# Altium footprint library CUSTOM PCB.PcbLib: 404 footprints (part 20 of 26)
Each footprint in its own frame and in the unit in brackets; x right, y up, seen from the top. Pads: shape width x height; smd on the part's side, far side on the other; paste and mask are expansions set on the pad; w line width, h text height; cw(c..) or ccw(c..) is an arc to the next point about the centre after c.
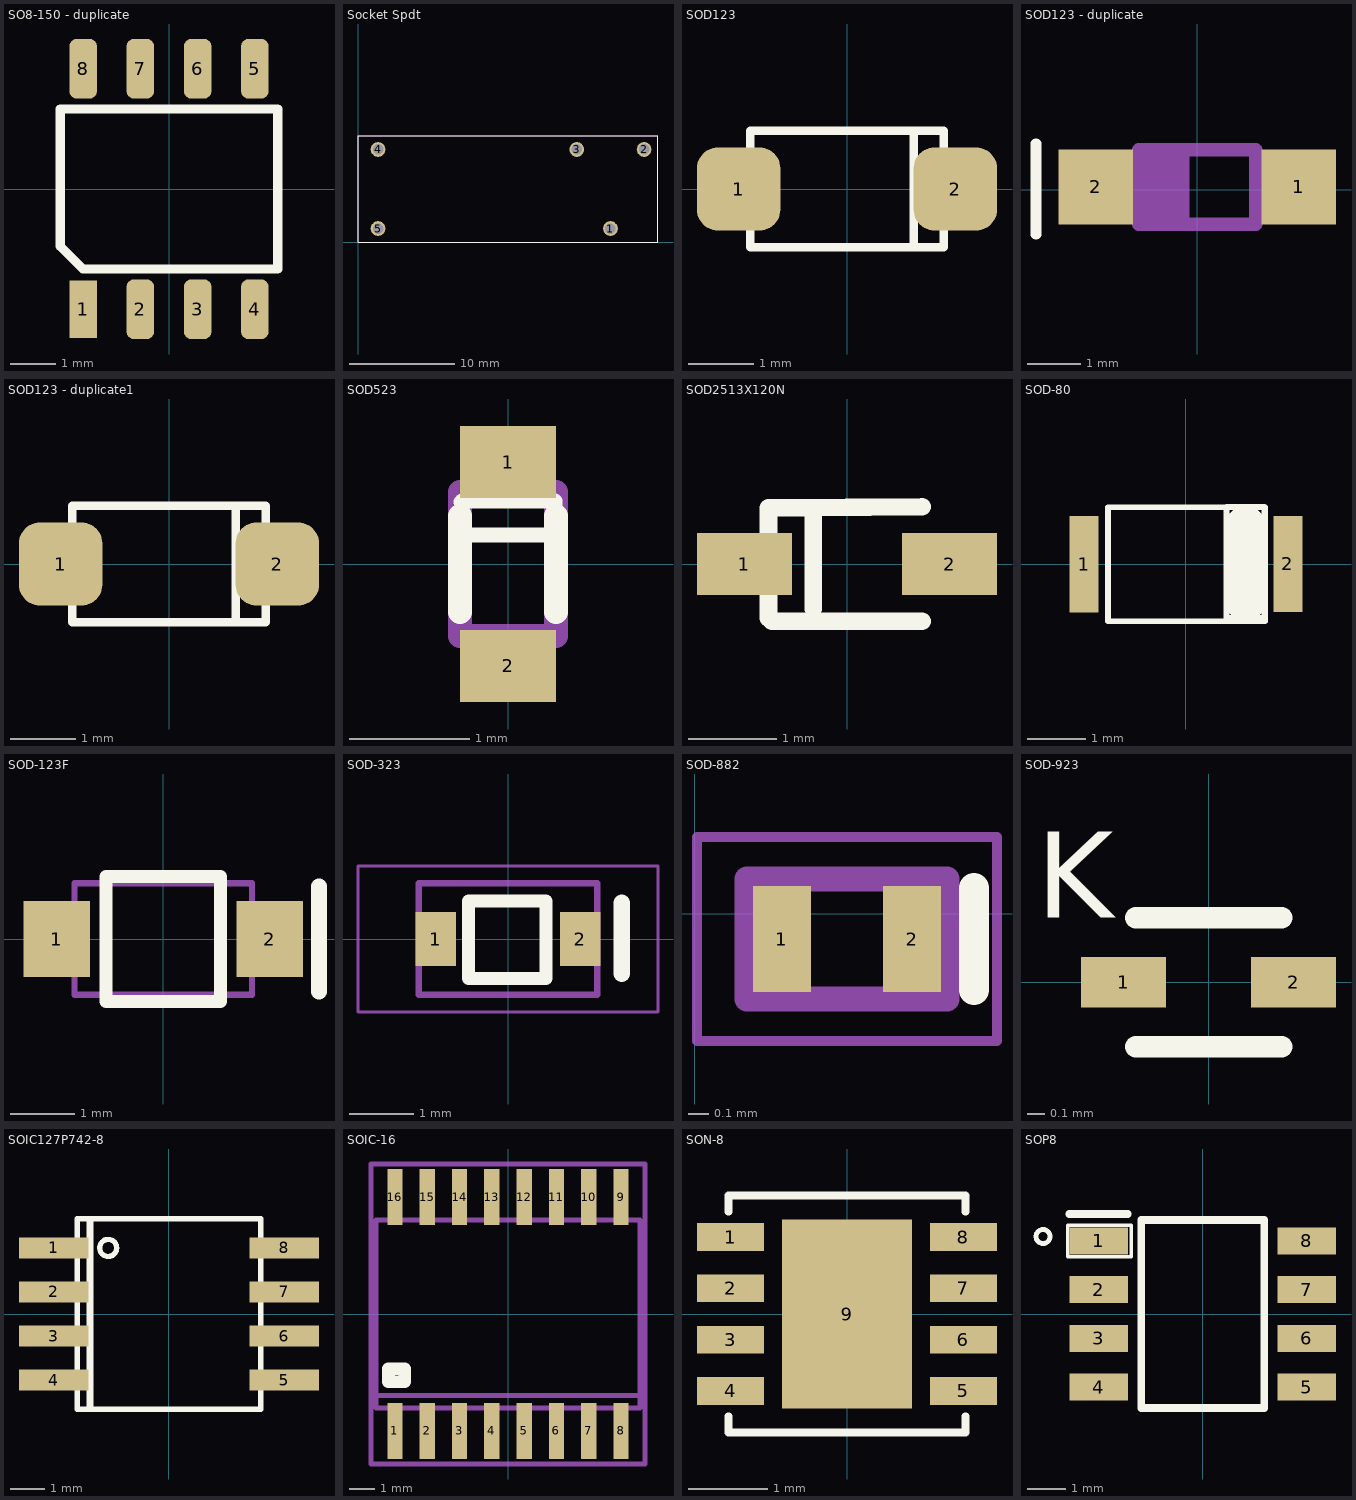
[diagram p19: the footprints below, top view; thin cyan lines are the x and y axes]

## SO8-150 - duplicate [mil]
pads (8):
  rect 24x50 smd mask+4: 1(-75,-105)
  rrect50% 24x52 smd mask+4: 2(-25,-105) 3(25,-105) 4(75,-105) 5(75,105) 6(25,105) 7(-25,105) 8(-75,105)
Top Overlay:
  lines w8: -95.01,-49.99 -75,-70 95,-70 95,70 -95.01,70 -95.01,-49.99
3D body "SO8-150.STEP": height 67, standoff 0, extent -95.01,-122.01 94.99,121.99

## Socket Spdt [mm] "RY211005"
pads (5):
  round 1.4 hole 1: 1(24.003,1.321) 2(27.203,8.839) 3(20.803,8.839) 4(1.905,8.839) 5(1.905,1.321)
Top Overlay:
  lines w0.025: 0,0 0,10.16 28.524,10.16 28.524,0 0,0
Mechanical 1:
  lines w0.025: 0,0 0,10.16 28.524,10.16 28.524,0 0,0
3D body "c-4-1393224-2-a-3d.stp": height 12.3, standoff -3.2, extent 0.012,0.03 28.512,10.13

## SOD123 [mil]
pads (2):
  rrect50% 50x50 smd: 1(-65,0) 2(65,0)
Top Overlay:
  lines w5: 40,-35 40,35 ; -58,-35 58,-35 58,35 -58,35 -58,-35
3D body "SOD-123.STEP": height 46.85, standoff -3.15, extent -77,-35.43 76.54,35.43

## SOD123 - duplicate [mm]
pads (2):
  rect 1.4x1.4 smd: 1(1.9,0.051) 2(-1.9,0.051)
Top Overlay:
  lines w0.2: -3.023,-0.838 -3.023,0.864
Mechanical 4:
  region: -1.952,0.451 -1.2,0.451 -1.2,-0.4 -1.952,-0.4
  region: 1.201,0.451 1.95,0.451 1.95,-0.4 1.201,-0.4
  region: -1.05,0.751 -0.15,0.751 -0.15,-0.599 -1.05,-0.599
  region: -1.952,0.451 -1.2,0.451 -1.2,-0.4 -1.952,-0.4
  region: 1.201,0.451 1.95,0.451 1.95,-0.4 1.201,-0.4
  region: -1.05,0.751 -0.15,0.751 -0.15,-0.599 -1.05,-0.599
  lines w0.254: -1.1,-0.649 1.1,-0.649 ; -1.1,-0.649 -1.1,0.751 ; -1.1,-0.649 1.1,-0.649 ; -1.1,-0.649 -1.1,0.751 ; -1.1,0.751 1.1,0.751 ; -1.1,0.751 1.1,0.751 ; 1.1,-0.649 1.1,0.751 ; 1.1,-0.649 1.1,0.751
3D body "sod123 v4.step": height 1.2, standoff 0, extent -1.875,-0.787 1.875,0.913

## SOD123 - duplicate1 [mil]
pads (2):
  rrect50% 50x50 smd: 1(-65,0) 2(65,0)
Top Overlay:
  lines w5: 40,-35 40,35 ; -58,-35 -58,35 58,35 58,-35 -58,-35
3D body "SOD-123.STEP": height 46.85, standoff -3.15, extent -77,-35.43 76.54,35.43

## SOD523 [mm]
pads (2):
  rect 0.8x0.6 smd: 1(0,0.85) 2(0,-0.85)
Top Overlay:
  lines w0.127: -0.389,0.242 0.391,0.242 0.391,0.524 -0.382,0.524 -0.389,0.517
  lines w0.2: -0.4,-0.4 -0.4,0.4 ; 0.4,-0.4 0.4,0.4
Mechanical 15:
  lines w0.2: -0.4,-0.6 -0.4,0.6 0.4,0.6 0.4,-0.6 -0.4,-0.6
3D body "User Library-SOD-523F.step": height 0.7, standoff 0, extent -0.399,-0.8 0.399,0.8

## SOD2513X120N [mm]
pads (2):
  rect 1.075x0.7 smd: 1(-1.162,0) 2(1.162,0)
Top Overlay:
  lines w0.2: -0.889,-0.611 -0.889,0.635 0.85,0.65 ; -0.85,-0.65 0.85,-0.65 ; -0.381,-0.508 -0.381,0.635
3D body "1N4148WS-7-F.stp": height 1.2, standoff 0, extent -1.338,-0.65 1.162,0.65

## SOD-80 [mm]
pads (2):
  rect 0.5x1.65 smd: 1(-1.747,-0.003) 2(1.747,0.003)
Top Overlay:
  lines w0.1: 1.346,0.981 0.695,0.981 0.695,-0.926 1.346,-0.926 1.346,0.985 ; -1.336,-0.98 -1.336,0.975 1.354,0.975 1.354,-0.98 -1.336,-0.98
  lines w0.7: 1.02,-0.627 1.02,0.647
3D body "User Library-SOD-80.STEP": height 1.45, standoff -0.05, extent -1.72,-0.753 1.739,0.757

## SOD-123F [mm]
pads (2):
  rect 1.03x1.17 smd: 1(-1.65,0) 2(1.65,0)
Top Overlay:
  lines w0.2: -0.889,-0.965 -0.889,0.965 0.889,0.965 0.889,-0.965 -0.889,-0.965
  lines w0.254: 2.413,-0.813 2.413,0.813
Mechanical 15:
  lines w0.1: -1.375,-0.862 1.375,-0.862 1.375,0.862 -1.375,0.862 -1.375,-0.862
3D body "SOD-123FL.SLDPRT": height 1.27, standoff -0.08, extent -1.925,-1.076 1.925,1.077

## SOD-323 [mm]
pads (2):
  rect 0.63x0.83 smd: 1(-1.115,0) 2(1.115,0)
Top Overlay:
  lines w0.2: -0.61,-0.61 -0.61,0.584 0.584,0.584 0.584,-0.61 -0.61,-0.61
  lines w0.254: 1.753,-0.533 1.753,0.559
Mechanical 15:
  lines w0.1: -1.375,-0.862 1.375,-0.862 1.375,0.862 -1.375,0.862 -1.375,-0.862
Mechanical 20:
  lines w0.05: -2.315,-1.125 2.315,-1.125 2.315,1.125 -2.315,1.125 -2.315,-1.125
3D body "User Library-SOD323.x_t": height 0.9, standoff -0.09, extent -1.25,-0.625 1.25,0.625

## SOD-882 [mm] "zener diode smd"
pads (2):
  rect 0.29x0.53 smd: 1(0.437,-0.127) 2(1.087,-0.127)
Top Overlay:
  lines w0.15: 1.397,-0.381 1.397,0.127
Mechanical 1:
  lines w0.127: 0.262,-0.427 0.262,0.173 1.262,0.173 1.262,-0.427 0.262,-0.427
Mechanical 4:
  lines w0.05: 0.012,-0.637 0.012,0.383 1.512,0.383 1.512,-0.637 0.012,-0.637
3D body "User Library-SOD882.SLDPRT": height 0.39, standoff -0.11, extent 0.251,-0.438 1.273,0.184

## SOD-923 [mm]
pads (2):
  rect 0.5x0.3 smd: 1(-0.5,0) 2(0.5,0)
Top Overlay:
  lines w0.127: -0.43,-0.38 0.43,-0.38 ; -0.43,0.38 0.43,0.38
  text "K" at -1.016,0.381 h0.51
3D body "User Library-DIODE_SOD-923.x_t": height 0.43, standoff 0, extent -0.525,-0.325 0.525,0.325

## SOIC127P742-8 [mm]
pads (8):
  rect 2x0.6 smd: 1(-3.322,1.905) 2(-3.322,0.635) 3(-3.322,-0.635) 4(-3.322,-1.905) 5(3.322,-1.905) 6(3.322,-0.635) 7(3.322,0.635) 8(3.322,1.905)
Top Overlay:
  circle w0.15: c-1.753,1.905 r0.246
  lines w0.15: -2.645,-2.745 2.645,-2.745 2.645,2.745 -2.645,2.745 -2.645,-2.745
  lines w0.2: -2.271,-2.713 -2.271,2.718
3D body "8SIOC.stp": height 1.9, standoff -0.05, extent -3.099,-2.502 3.099,2.502

## SOIC-16 [mm] "Ds3231 RTC"
pads (16):
  rect 0.6x2.2 smd: 1(-4.445,-4.6) 2(-3.175,-4.6) 3(-1.905,-4.6) 4(-0.635,-4.6) 5(0.635,-4.6) 6(1.905,-4.6) 7(3.175,-4.6) 8(4.445,-4.6) 9(4.445,4.6) 10(3.175,4.6) 11(1.905,4.6) 12(0.635,4.6) 13(-0.635,4.6) 14(-1.905,4.6) 15(-3.175,4.6) 16(-4.445,4.6)
Top Overlay:
  lines w0.5: -4.699,-2.667 -4.699,-2.159 -4.064,-2.159 -4.064,-2.667 -4.699,-2.667
Mechanical 4:
  region: -4.698,-3.8 -4.2,-3.8 -4.2,-5.329 -4.698,-5.329
  region: -3.421,-3.8 -2.93,-3.8 -2.93,-5.322 -3.421,-5.322
  region: -2.153,-3.8 -1.66,-3.8 -1.66,-5.326 -2.153,-5.326
  region: -0.882,-3.8 -0.39,-3.8 -0.39,-5.329 -0.882,-5.329
  region: 0.39,-3.8 0.88,-3.8 0.88,-5.321 0.39,-5.321
  region: 1.662,-3.8 2.15,-3.8 2.15,-5.327 1.662,-5.327
  region: 2.932,-3.8 3.42,-3.8 3.42,-5.323 2.932,-5.323
  region: 4.204,-3.8 4.69,-3.8 4.69,-5.325 4.204,-5.325
  region: 4.204,5.32 4.69,5.32 4.69,3.804 4.204,3.804
  region: 2.934,5.32 3.42,5.32 3.42,3.806 2.934,3.806
  region: 1.66,5.32 2.15,5.32 2.15,3.801 1.66,3.801
  region: 0.391,5.32 0.88,5.32 0.88,3.807 0.391,3.807
  region: -0.882,5.32 -0.39,5.32 -0.39,3.807 -0.882,3.807
  region: -2.15,5.32 -1.66,5.32 -1.66,3.801 -2.15,3.801
  region: -3.423,5.32 -2.93,5.32 -2.93,3.804 -3.423,3.804
  region: -4.695,5.32 -4.2,5.32 -4.2,3.804 -4.695,3.804
  region: -4.698,-3.8 -4.2,-3.8 -4.2,-5.329 -4.698,-5.329
  region: -3.421,-3.8 -2.93,-3.8 -2.93,-5.322 -3.421,-5.322
  region: -2.153,-3.8 -1.66,-3.8 -1.66,-5.326 -2.153,-5.326
  region: -0.882,-3.8 -0.39,-3.8 -0.39,-5.329 -0.882,-5.329
  region: 0.39,-3.8 0.88,-3.8 0.88,-5.321 0.39,-5.321
  region: 1.662,-3.8 2.15,-3.8 2.15,-5.327 1.662,-5.327
  region: 2.932,-3.8 3.42,-3.8 3.42,-5.323 2.932,-5.323
  region: 4.204,-3.8 4.69,-3.8 4.69,-5.325 4.204,-5.325
  region: 4.204,5.32 4.69,5.32 4.69,3.804 4.204,3.804
  region: 2.934,5.32 3.42,5.32 3.42,3.806 2.934,3.806
  region: 1.66,5.32 2.15,5.32 2.15,3.801 1.66,3.801
  region: 0.391,5.32 0.88,5.32 0.88,3.807 0.391,3.807
  region: -0.882,5.32 -0.39,5.32 -0.39,3.807 -0.882,3.807
  region: -2.15,5.32 -1.66,5.32 -1.66,3.801 -2.15,3.801
  region: -3.423,5.32 -2.93,5.32 -2.93,3.804 -3.423,3.804
  region: -4.695,5.32 -4.2,5.32 -4.2,3.804 -4.695,3.804
  lines w0.203: -5.19,-3.7 5.19,-3.7 ; -5.19,-3.7 -5.19,-3.2 ; -5.19,-3.7 5.19,-3.7 ; -5.19,-3.7 -5.19,-3.2 ; -5.19,-3.2 -5.19,3.7 ; -5.19,-3.2 5.19,-3.2 ; -5.19,-3.2 -5.19,3.7 ; -5.19,-3.2 5.19,-3.2 ; -5.19,3.7 5.19,3.7 ; -5.19,3.7 5.19,3.7 ; 5.19,-3.7 5.19,-3.2 ; 5.19,-3.7 5.19,-3.2 ; 5.19,-3.2 5.19,3.7 ; 5.19,-3.2 5.19,3.7
Mechanical 13:
  lines w0.2: -5.395,-5.9 -5.395,5.9 5.395,5.9 5.395,-5.9 -5.395,-5.9
3D body "Package, SOIC-16, 7.5mm.STEP": height 2.3, standoff 0, extent -5.15,-5.15 5.15,5.15

## SON-8 [mm]
pads (9):
  rect 0.85x0.35 smd: 1(-1.475,0.975) 2(-1.475,0.325) 3(-1.475,-0.325) 4(-1.475,-0.975) 5(1.475,-0.975) 6(1.475,-0.325) 7(1.475,0.325) 8(1.475,0.975)
  rect 1.65x2.4 smd: 9(0,0)
Top Layer:
  region: 0,1.2
  region: 0,-1.2
Top Overlay:
  lines w0.1: -1.5,-1.295 -1.5,-1.5 1.5,-1.5 1.5,-1.295 ; -1.5,1.295 -1.5,1.5 1.5,1.5 1.5,1.295
  text "." at -2.311,0.965 h0.5
Top Paste:
  region: 0,1.2
  region: 0,-1.2
Top Solder:
  region: 0,1.2
  region: 0,-1.2
3D body "DRB0008B.stp": height 0.77, standoff 0, extent -1.5,-1.5 1.5,1.5

## SOP8 [mm]
pads (8):
  rect 1.525x0.7 smd: 1(-2.712,1.905) 2(-2.712,0.635) 3(-2.712,-0.635) 4(-2.712,-1.905) 5(2.712,-1.905) 6(2.712,-0.635) 7(2.712,0.635) 8(2.712,1.905)
Top Overlay:
  circle w0.127: c-4.163,2.02 r0.183
  lines w0.09: -3.522,1.492 -3.519,2.309 -1.858,2.315 -1.865,1.498 -3.522,1.492
  lines w0.2: -3.475,2.605 -1.95,2.605 ; -1.6,-2.45 -1.6,2.45 1.6,2.45 1.6,-2.45 -1.6,-2.45
3D body "SGL8022W_SOP8.stp": height 1.77, standoff 0, extent -2.99,-2.42 3.01,2.48